# Altium footprint library Footprints.PcbLib: 118 footprints (part 4 of 8)
Each footprint in its own frame and in the unit in brackets; x right, y up, seen from the top. Pads: shape width x height; smd on the part's side, far side on the other; paste and mask are expansions set on the pad; w line width, h text height; cw(c..) or ccw(c..) is an arc to the next point about the centre after c.
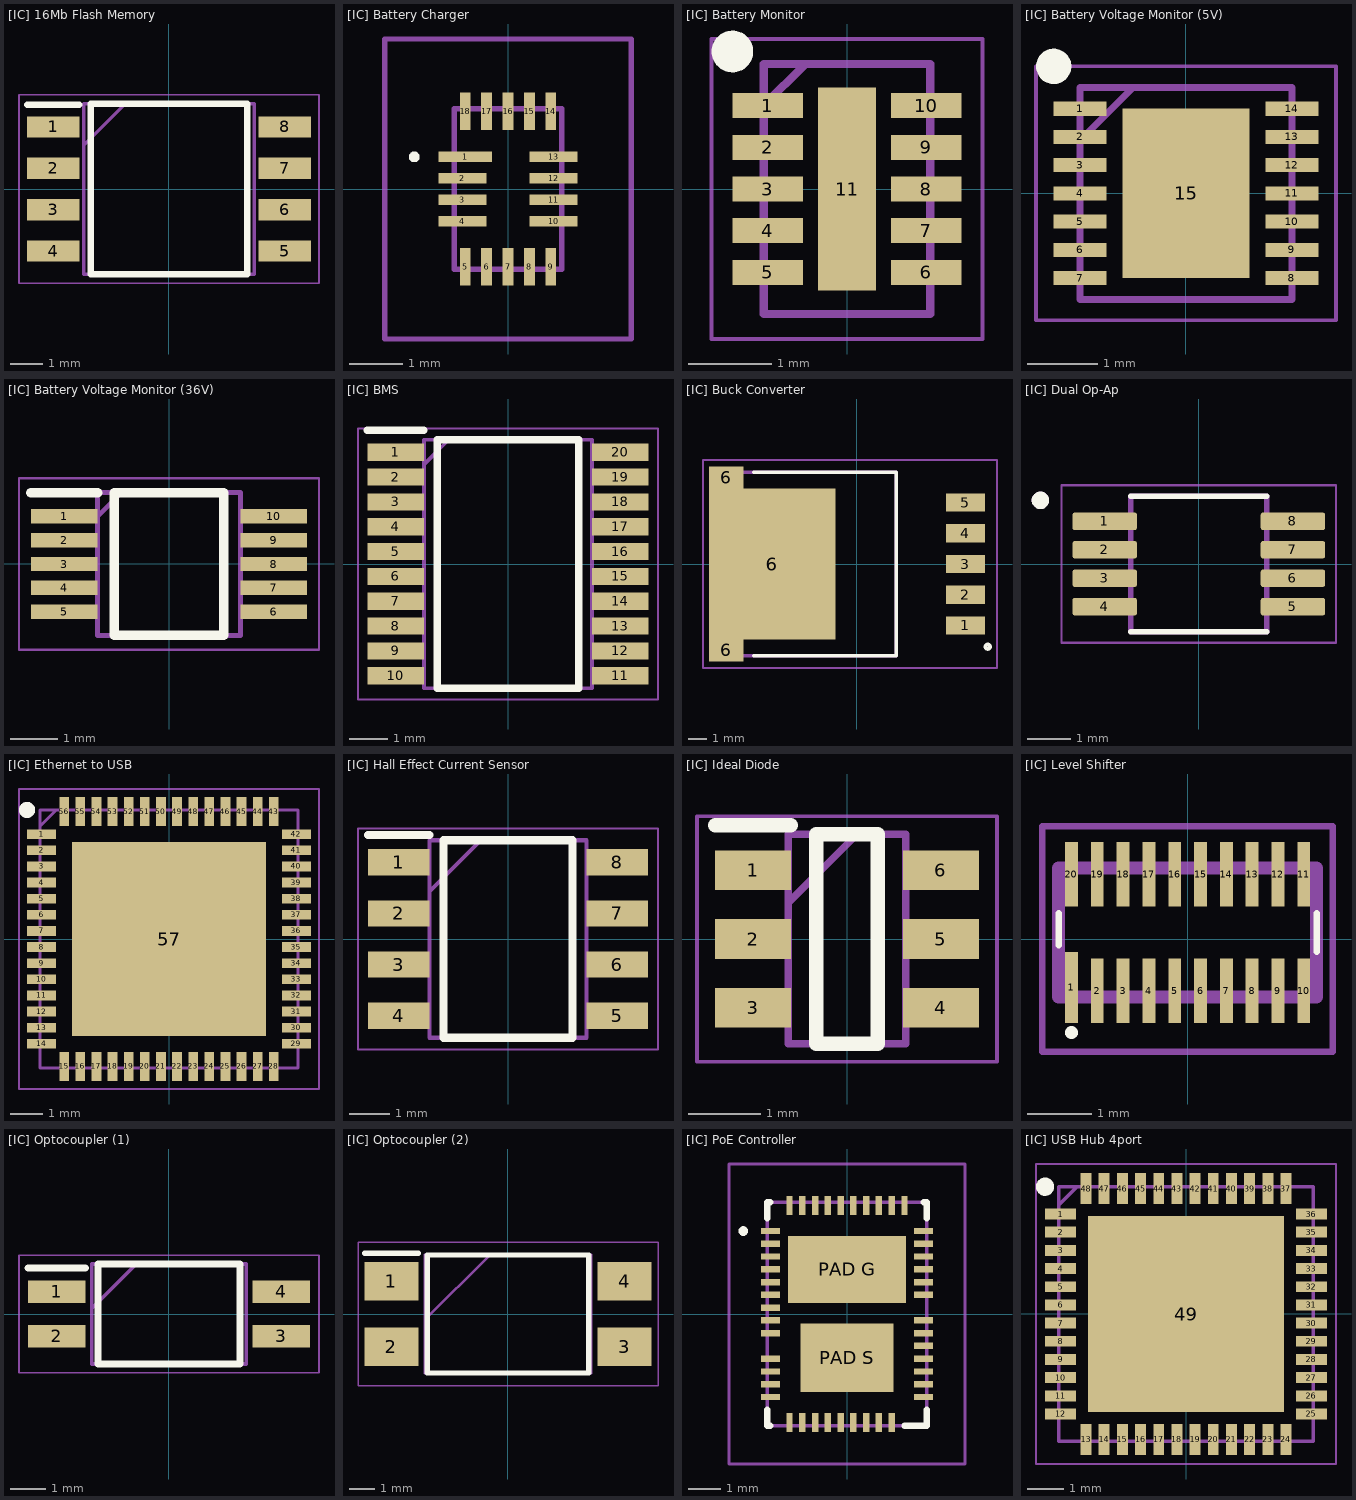
[diagram p3: the footprints below, top view; thin cyan lines are the x and y axes]

## [IC] 16Mb Flash Memory [mm] "W25Q128JVSIQ TR"
pads (8):
  rect 1.6x0.65 smd: 1(-3.55,1.905) 2(-3.55,0.635) 3(-3.55,-0.635) 4(-3.55,-1.905) 5(3.55,-1.905) 6(3.55,-0.635) 7(3.55,0.635) 8(3.55,1.905)
Top Overlay:
  lines w0.2: -4.35,2.58 -2.75,2.58 ; -2.4,-2.615 -2.4,2.615 2.4,2.615 2.4,-2.615 -2.4,-2.615
Physical Outline:
  lines w0.1: -2.615,1.345 -1.345,2.615 ; -2.615,-2.615 -2.615,2.615 2.615,2.615 2.615,-2.615 -2.615,-2.615
Part Border:
  lines w0.05: -4.6,-2.89 -4.6,2.89 4.6,2.89 4.6,-2.89 -4.6,-2.89
3D body "W25Q128JVSIQ_TR.stp": height 1.95, standoff 0, extent -3.9,-2.615 3.9,2.615

## [IC] Battery Charger [mm] "MP2672GD"
pads (18):
  rect 1x0.2 smd: 1(-0.8,0.6)
  rect 0.9x0.2 smd: 2(-0.85,0.2) 3(-0.85,-0.2) 4(-0.85,-0.6) 10(0.85,-0.6) 11(0.85,-0.2) 12(0.85,0.2) 13(0.85,0.6)
  rect 0.2x0.7 smd: 5(-0.8,-1.45) 6(-0.4,-1.45) 7(0,-1.45) 8(0.4,-1.45) 9(0.8,-1.45) 14(0.8,1.45) 15(0.4,1.45) 16(0,1.45) 17(-0.4,1.45) 18(-0.8,1.45)
Top Overlay:
  lines w0.1: -1.8,0.6 cw(c-1.75,0.6) -1.7,0.6 cw(c-1.75,0.6) -1.8,0.6
Physical Outline:
  lines w0.1: -1,-1.5 -1,1.5 1,1.5 1,-1.5 -1,-1.5
Part Border:
  lines w0.1: -2.3,-2.8 -2.3,2.8 2.3,2.8 2.3,-2.8 -2.3,-2.8
3D body "MP2672GD-0000-Z.stp": height 0.9, standoff 0, extent -1.005,-1.505 1.005,1.505

## [IC] Battery Monitor [mm] "LTC2959"
pads (11):
  rect 0.85x0.3 smd: 1(-0.95,1) 2(-0.95,0.5) 3(-0.95,0) 4(-0.95,-0.5) 5(-0.95,-1) 6(0.95,-1) 7(0.95,-0.5) 8(0.95,0) 9(0.95,0.5) 10(0.95,1)
  rect 0.69x2.44 smd: 11(0,0)
Top Overlay:
  circle w0.25: c-1.375,1.65 r0.125
Physical Outline:
  lines w0.1: -1,1 -0.5,1.5 ; -1,-1.5 -1,1.5 1,1.5 1,-1.5 -1,-1.5
Part Border:
  lines w0.05: -1.625,-1.8 -1.625,1.8 1.625,1.8 1.625,-1.8 -1.625,-1.8
3D body "LTC2959IDDB#TRMPBF.stp": height 0.8, standoff 0, extent -1.05,-1.5 1.05,1.5

## [IC] Battery Voltage Monitor (5V) [mm] "MAX17260SETD+"
pads (15):
  rect 0.75x0.2 smd: 1(-1.5,1.2) 2(-1.5,0.8) 3(-1.5,0.4) 4(-1.5,0) 5(-1.5,-0.4) 6(-1.5,-0.8) 7(-1.5,-1.2) 8(1.5,-1.2) 9(1.5,-0.8) 10(1.5,-0.4) 11(1.5,0) 12(1.5,0.4) 13(1.5,0.8) 14(1.5,1.2)
  rect 1.8x2.4 smd: 15(0,0)
Top Overlay:
  circle w0.25: c-1.875,1.8 r0.125
Physical Outline:
  lines w0.1: -1.5,0.75 -0.75,1.5 ; -1.5,-1.5 1.5,-1.5 1.5,1.5 -1.5,1.5 -1.5,-1.5
Part Border:
  lines w0.05: -2.125,-1.8 2.125,-1.8 2.125,1.8 -2.125,1.8 -2.125,-1.8
3D body "MAX17260SETD+.stp": height 0.8, standoff 0, extent -1.5,-1.46 1.5,1.54

## [IC] Battery Voltage Monitor (36V) [mm] "INA226AIDGST"
pads (10):
  rect 1.4x0.3 smd: 1(-2.2,1) 2(-2.2,0.5) 3(-2.2,0) 4(-2.2,-0.5) 5(-2.2,-1) 6(2.2,-1) 7(2.2,-0.5) 8(2.2,0) 9(2.2,0.5) 10(2.2,1)
Top Overlay:
  lines w0.2: -2.9,1.5 -1.5,1.5 ; -1.15,-1.5 1.15,-1.5 1.15,1.5 -1.15,1.5 -1.15,-1.5
Physical Outline:
  lines w0.1: -1.5,1 -1,1.5 ; -1.5,-1.5 1.5,-1.5 1.5,1.5 -1.5,1.5 -1.5,-1.5
Part Border:
  lines w0.05: -3.15,-1.8 3.15,-1.8 3.15,1.8 -3.15,1.8 -3.15,-1.8
3D body "INA226AIDGST.stp": height 1.1, standoff 0, extent -2.463,-1.5 2.462,1.5

## [IC] BMS [mm] "BQ7692"
pads (20):
  rect 1.475x0.45 smd: 1(-2.938,2.925) 2(-2.938,2.275) 3(-2.938,1.625) 4(-2.938,0.975) 5(-2.938,0.325) 6(-2.938,-0.325) 7(-2.938,-0.975) 8(-2.938,-1.625) 9(-2.938,-2.275) 10(-2.938,-2.925) 11(2.938,-2.925) 12(2.938,-2.275) 13(2.938,-1.625) 14(2.938,-0.975) 15(2.938,-0.325) 16(2.938,0.325) 17(2.938,0.975) 18(2.938,1.625) 19(2.938,2.275) 20(2.938,2.925)
Top Overlay:
  lines w0.2: -3.675,3.5 -2.2,3.5 ; -1.85,-3.25 1.85,-3.25 1.85,3.25 -1.85,3.25 -1.85,-3.25
Physical Outline:
  lines w0.1: -2.2,2.6 -1.55,3.25 ; -2.2,-3.25 2.2,-3.25 2.2,3.25 -2.2,3.25 -2.2,-3.25
Part Border:
  lines w0.05: -3.925,-3.55 3.925,-3.55 3.925,3.55 -3.925,3.55 -3.925,-3.55
3D body "BQ7692003PW.stp": height 1.13, standoff 0, extent -3.2,-3.25 3.2,3.25

## [IC] Buck Converter [mm] "LM2576"
pads (8):
  rect 2.16x1.02 smd: 1(6,-3.4) 2(6,-1.7) 3(6,0) 4(6,1.7) 5(6,3.4)
  rect 1.91x1.235 smd: 6(-7.215,-4.782) 6(-7.215,4.782)
  rect 6.99x8.33 smd: 6(-4.675,0)
Top Overlay:
  circle w0.2: c7.239,-4.572 r0.126
  lines w0.2: -5.705,-5.08 2.179,-5.08 2.179,5.08 -5.705,5.08
Physical Outline:
  lines w0.2: -6.461,-5.08 -6.461,5.08 2.179,5.08 2.179,-5.08 -6.461,-5.08
Part Border:
  lines w0.1: -8.5,-5.75 7.75,-5.75 7.75,5.75 -8.5,5.75 -8.5,-5.75
3D body "LM2576HVS-12_NOPB.stp": height 4.72, standoff 0, extent -7.571,-5.08 6.779,5.08

## [IC] Dual Op-Ap [mm] "LMV358IDGKR"
pads (8):
  rrect25% 1.47x0.4 smd: 1(-2.15,0.975) 2(-2.15,0.325) 3(-2.15,-0.325) 4(-2.15,-0.975) 5(2.15,-0.975) 6(2.15,-0.325) 7(2.15,0.325) 8(2.15,0.975)
Top Overlay:
  circle w0.2: c-3.62,1.455 r0.1
  lines w0.127: -1.55,-1.55 1.55,-1.55 ; -1.55,1.55 1.55,1.55
Physical Outline:
  circle w0.2: c-3.62,1.455 r0.1
  lines w0.127: -1.55,-1.55 1.55,-1.55 1.55,1.55 -1.55,1.55 -1.55,-1.55
Part Border:
  lines w0.05: -3.135,-1.8 3.135,-1.8 3.135,1.8 -3.135,1.8 -3.135,-1.8
3D body "SMD Dual Op-Ap (LMV358IDGKR).STEP": height 1.1, standoff 0, extent -2.45,-1.5 2.45,1.5

## [IC] Ethernet to USB [mm] "LAN7500I-ABZJ"
pads (57):
  rect 0.9x0.3 smd: 1(-3.95,3.25) 2(-3.95,2.75) 3(-3.95,2.25) 4(-3.95,1.75) 5(-3.95,1.25) 6(-3.95,0.75) 7(-3.95,0.25) 8(-3.95,-0.25) 9(-3.95,-0.75) 10(-3.95,-1.25) 11(-3.95,-1.75) 12(-3.95,-2.25) 13(-3.95,-2.75) 14(-3.95,-3.25) 29(3.95,-3.25) 30(3.95,-2.75) 31(3.95,-2.25) 32(3.95,-1.75) 33(3.95,-1.25) 34(3.95,-0.75) 35(3.95,-0.25) 36(3.95,0.25) 37(3.95,0.75) 38(3.95,1.25) 39(3.95,1.75) 40(3.95,2.25) 41(3.95,2.75) 42(3.95,3.25)
  rect 0.3x0.9 smd: 15(-3.25,-3.95) 16(-2.75,-3.95) 17(-2.25,-3.95) 18(-1.75,-3.95) 19(-1.25,-3.95) 20(-0.75,-3.95) 21(-0.25,-3.95) 22(0.25,-3.95) 23(0.75,-3.95) 24(1.25,-3.95) 25(1.75,-3.95) 26(2.25,-3.95) 27(2.75,-3.95) 28(3.25,-3.95) 43(3.25,3.95) 44(2.75,3.95) 45(2.25,3.95) 46(1.75,3.95) 47(1.25,3.95) 48(0.75,3.95) 49(0.25,3.95) 50(-0.25,3.95) 51(-0.75,3.95) 52(-1.25,3.95) 53(-1.75,3.95) 54(-2.25,3.95) 55(-2.75,3.95) 56(-3.25,3.95)
  rect 6x6 smd: 57(0,0)
Top Overlay:
  circle w0.25: c-4.4,4 r0.125
Physical Outline:
  lines w0.1: -4,3.5 -3.5,4 ; -4,-4 4,-4 4,4 -4,4 -4,-4
Part Border:
  lines w0.05: -4.65,-4.65 4.65,-4.65 4.65,4.65 -4.65,4.65 -4.65,-4.65
3D body "LAN7500I-ABZJ.stp": height 1, standoff 0, extent -4.05,-4.05 4.05,4.05

## [IC] Hall Effect Current Sensor [mm] "TMCS1100"
pads (8):
  rect 1.528x0.65 smd: 1(-2.711,1.905) 2(-2.711,0.635) 3(-2.711,-0.635) 4(-2.711,-1.905) 5(2.711,-1.905) 6(2.711,-0.635) 7(2.711,0.635) 8(2.711,1.905)
Top Overlay:
  lines w0.2: -3.475,2.58 -1.948,2.58 ; -1.598,-2.452 -1.598,2.452 1.598,2.452 1.598,-2.452 -1.598,-2.452
Physical Outline:
  lines w0.1: -1.948,1.182 -0.678,2.452 ; -1.948,-2.452 -1.948,2.452 1.948,2.452 1.948,-2.452 -1.948,-2.452
Part Border:
  lines w0.05: -3.725,-2.75 -3.725,2.75 3.725,2.75 3.725,-2.75 -3.725,-2.75
3D body "TMCS1100A3QDR.stp": height 1.63, standoff 0, extent -3.011,-2.451 3.011,2.451

## [IC] Ideal Diode [mm] "LTC4412"
pads (6):
  rect 1.05x0.55 smd: 1(-1.3,0.95) 2(-1.3,0) 3(-1.3,-0.95) 4(1.3,-0.95) 5(1.3,0) 6(1.3,0.95)
Top Overlay:
  lines w0.2: -1.825,1.575 -0.775,1.575 ; -0.425,-1.45 -0.425,1.45 0.425,1.45 0.425,-1.45 -0.425,-1.45
Physical Outline:
  lines w0.1: -0.812,0.5 0.138,1.45 ; -0.812,-1.45 -0.812,1.45 0.812,1.45 0.812,-1.45 -0.812,-1.45
Part Border:
  lines w0.05: -2.075,-1.7 -2.075,1.7 2.075,1.7 2.075,-1.7 -2.075,-1.7
3D body "LTC4412IS6#TRPBF.stp": height 1, standoff 0, extent -1.4,-1.45 1.4,1.45

## [IC] Level Shifter [mm] "TXB0108DQSR"
pads (20):
  rect 0.2x1.1 smd: 1(-1.8,-0.75)
  rect 0.2x1 smd: 2(-1.4,-0.8) 3(-1,-0.8) 4(-0.6,-0.8) 5(-0.2,-0.8) 6(0.2,-0.8) 7(0.6,-0.8) 8(1,-0.8) 9(1.4,-0.8) 10(1.8,-0.8) 11(1.8,1) 12(1.4,1) 13(1,1) 14(0.6,1) 15(0.2,1) 16(-0.2,1) 17(-0.6,1) 18(-1,1) 19(-1.4,1) 20(-1.8,1)
Top Overlay:
  lines w0.1: -2,-0.1 -2,0.4 ; 2,-0.2 2,0.4 ; -1.85,-1.45 cw(c-1.8,-1.45) -1.75,-1.45 cw(c-1.8,-1.45) -1.85,-1.45
Physical Outline:
  lines w0.2: -2,-0.9 2,-0.9 2,1.1 -2,1.1 -2,-0.9
Part Border:
  lines w0.1: -2.25,-1.75 2.25,-1.75 2.25,1.75 -2.25,1.75 ; -2.25,-1.75 -2.25,1.75
3D body "TXB0108DQSR.stp": height 0.55, standoff 0, extent -2,-0.9 2,1.1

## [IC] Optocoupler (1) [mm] "SSOP-4"
pads (4):
  rect 1.65x0.65 smd: 1(-3.2,0.635) 2(-3.2,-0.635) 3(3.2,-0.635) 4(3.2,0.635)
Top Overlay:
  lines w0.2: -4.025,1.31 -2.375,1.31 ; -2.025,-1.425 -2.025,1.425 2.025,1.425 2.025,-1.425 -2.025,-1.425
Physical Outline:
  lines w0.1: -2.2,0.155 -0.93,1.425 ; -2.2,-1.425 -2.2,1.425 2.2,1.425 2.2,-1.425 -2.2,-1.425
Part Border:
  lines w0.05: -4.275,-1.675 -4.275,1.675 4.275,1.675 4.275,-1.675 -4.275,-1.675
3D body "Optocoupler TCMT1107.stp": height 2.1, standoff 0, extent -3.5,-1.3 3.5,1.3

## [IC] Optocoupler (2) [mm] "SOP254P1016X385-4N"
pads (4):
  rect 2.1x1.5 smd: 1(-4.55,1.27) 2(-4.55,-1.27) 3(4.55,-1.27) 4(4.55,1.27)
Top Overlay:
  lines w0.2: -5.6,2.37 -3.5,2.37 ; -3.15,-2.3 -3.15,2.3 3.15,2.3 3.15,-2.3 -3.15,-2.3
Physical Outline:
  lines w0.1: -3.25,-0.24 -0.71,2.3 ; -3.25,-2.3 -3.25,2.3 3.25,2.3 3.25,-2.3 -3.25,-2.3
Part Border:
  lines w0.05: -5.85,-2.8 -5.85,2.8 5.85,2.8 5.85,-2.8 -5.85,-2.8
3D body "FOD817DSD.stp": height 3.85, standoff 0, extent -5.08,-2.3 5.08,2.3

## [IC] PoE Controller [mm] "TPS23730RMTR"
pads (47):
  rect 0.6x0.2 smd: 1(-2.4,2.6) 2(-2.4,2.2) 3(-2.4,1.8) 4(-2.4,1.4) 5(-2.4,1) 6(-2.4,0.6) 7(-2.4,0.2) 8(-2.4,-0.2) 9(-2.4,-0.6) 10(-2.4,-1.4) 11(-2.4,-1.8) 12(-2.4,-2.2) 13(-2.4,-2.6) 23(2.4,-2.6) 24(2.4,-2.2) 25(2.4,-1.8) 26(2.4,-1.4) 27(2.4,-1) 28(2.4,-0.6) 29(2.4,-0.2) 30(2.4,0.6) 31(2.4,1) 32(2.4,1.4) 33(2.4,1.8) 34(2.4,2.2) 35(2.4,2.6)
  rect 0.2x0.6 smd: 14(-1.8,-3.4) 15(-1.4,-3.4) 16(-1,-3.4) 17(-0.6,-3.4) 18(-0.2,-3.4) 19(0.2,-3.4) 20(0.6,-3.4) 21(1,-3.4) 22(1.4,-3.4) 36(1.8,3.4) 37(1.4,3.4) 38(1,3.4) 39(0.6,3.4) 40(0.2,3.4) 41(-0.2,3.4) 42(-0.6,3.4) 43(-1,3.4) 44(-1.4,3.4) 45(-1.8,3.4)
  rect 3.7x2.1 smd: "PAD G"(0,1.4)
  rect 2.9x2.15 smd: "PAD S"(0,-1.375)
Top Overlay:
  lines w0.2: -2.5,-3 -2.5,-3.5 -2.4,-3.5 ; -2.5,3 -2.5,3.5 -2.4,3.5 ; 1.8,-3.5 2.5,-3.5 2.5,-3 ; 2.4,3.5 2.5,3.5 2.5,3 ; -3.3,2.6 ccw(c-3.25,2.6) -3.2,2.6 ; -3.3,2.6 cw(c-3.25,2.6) -3.2,2.6 ; -3.3,2.6 ccw(c-3.25,2.6) -3.2,2.6
Physical Outline:
  lines w0.1: -2.5,-3.5 2.5,-3.5 2.5,3.5 -2.5,3.5 -2.5,-3.5
Part Border:
  lines w0.1: -3.7,-4.7 3.7,-4.7 3.7,4.7 -3.7,4.7 -3.7,-4.7
3D body "TPS23730RMTR.stp": height 1, standoff 0, extent -2.5,-3.5 2.5,3.5

## [IC] USB Hub 4port [mm] "USB4715T-I/Y9X"
pads (49):
  rect 0.85x0.3 smd: 1(-3.45,2.75) 2(-3.45,2.25) 3(-3.45,1.75) 4(-3.45,1.25) 5(-3.45,0.75) 6(-3.45,0.25) 7(-3.45,-0.25) 8(-3.45,-0.75) 9(-3.45,-1.25) 10(-3.45,-1.75) 11(-3.45,-2.25) 12(-3.45,-2.75) 25(3.45,-2.75) 26(3.45,-2.25) 27(3.45,-1.75) 28(3.45,-1.25) 29(3.45,-0.75) 30(3.45,-0.25) 31(3.45,0.25) 32(3.45,0.75) 33(3.45,1.25) 34(3.45,1.75) 35(3.45,2.25) 36(3.45,2.75)
  rect 0.3x0.85 smd: 13(-2.75,-3.45) 14(-2.25,-3.45) 15(-1.75,-3.45) 16(-1.25,-3.45) 17(-0.75,-3.45) 18(-0.25,-3.45) 19(0.25,-3.45) 20(0.75,-3.45) 21(1.25,-3.45) 22(1.75,-3.45) 23(2.25,-3.45) 24(2.75,-3.45) 37(2.75,3.45) 38(2.25,3.45) 39(1.75,3.45) 40(1.25,3.45) 41(0.75,3.45) 42(0.25,3.45) 43(-0.25,3.45) 44(-0.75,3.45) 45(-1.25,3.45) 46(-1.75,3.45) 47(-2.25,3.45) 48(-2.75,3.45)
  rect 5.4x5.4 smd: 49(0,0)
Top Overlay:
  circle w0.25: c-3.875,3.5 r0.125
Physical Outline:
  lines w0.1: -3.5,3 -3,3.5 ; -3.5,-3.5 3.5,-3.5 3.5,3.5 -3.5,3.5 -3.5,-3.5
Part Border:
  lines w0.05: -4.125,-4.125 4.125,-4.125 4.125,4.125 -4.125,4.125 -4.125,-4.125
3D body "USB4715T-I_Y9X.stp": height 1, standoff 0, extent -3.55,-3.55 3.55,3.55